# Altium footprint library FootprintHole.PcbLib: 100 footprints (part 7 of 7)
Each footprint in its own frame and in the unit in brackets; x right, y up, seen from the top. Pads: shape width x height; smd on the part's side, far side on the other; paste and mask are expansions set on the pad; w line width, h text height; cw(c..) or ccw(c..) is an arc to the next point about the centre after c.
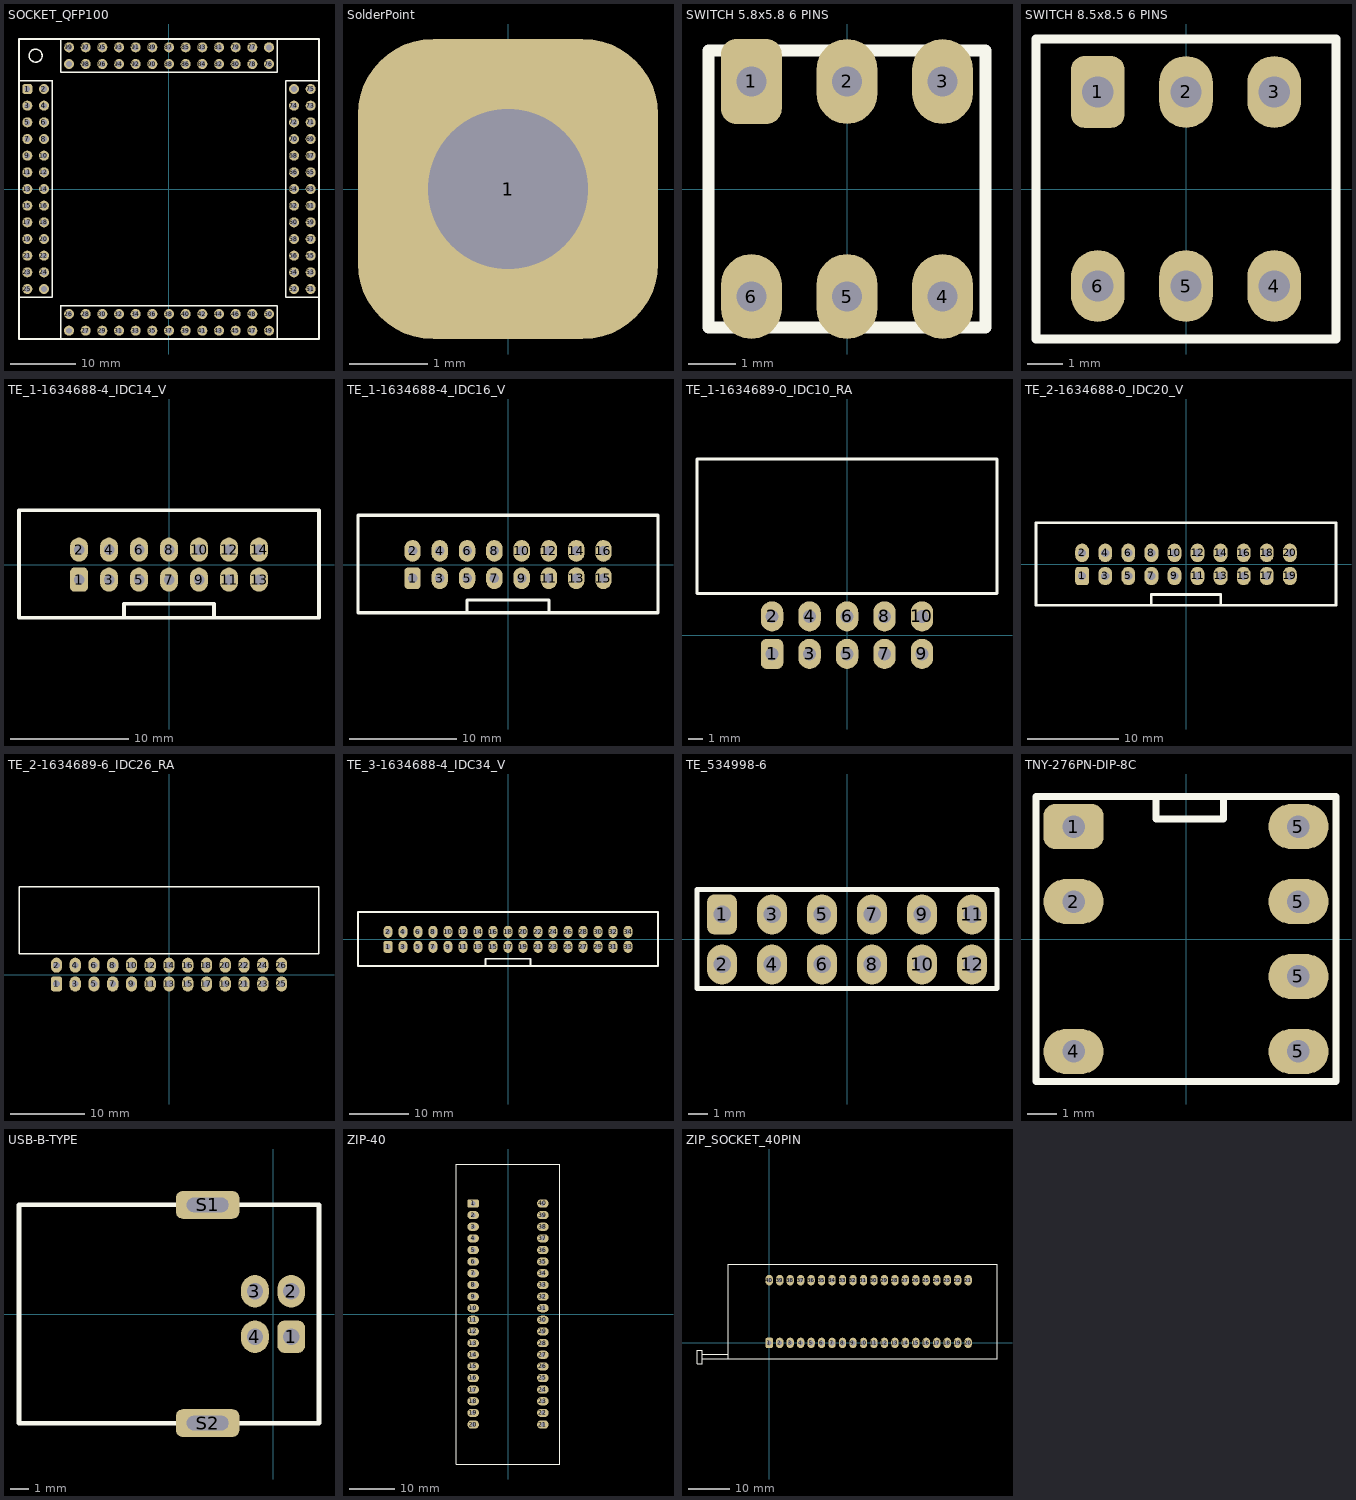
[diagram p6: the footprints below, top view; thin cyan lines are the x and y axes]

## SOCKET_QFP100 [mil]
pads (104):
  rrect50% 60x60 hole 35: 1(-850,600)
  round 60 hole 35: 2(-750,600) 3(-850,500) 4(-750,500) 5(-850,400) 6(-750,400) 7(-850,300) 8(-750,300) 9(-850,200) 10(-750,200) 11(-850,100) 12(-750,100) 13(-850,0) 14(-750,0) 15(-850,-100) 16(-750,-100) 17(-850,-200) 18(-750,-200) 19(-850,-300) 20(-750,-300) 21(-850,-400) 22(-750,-400) 23(-850,-500) 24(-750,-500) 25(-850,-600) 26(-600,-750) 27(-500,-850) 28(-500,-750) 29(-400,-850) 30(-400,-750) 31(-300,-850) 32(-300,-750) 33(-200,-850) 34(-200,-750) 35(-100,-850) 36(-100,-750) 37(0,-850) 38(0,-750) 39(100,-850) 40(100,-750) 41(200,-850) 42(200,-750) 43(300,-850) 44(300,-750) 45(400,-850) 46(400,-750) 47(500,-850) 48(500,-750) 49(600,-850) 50(600,-750) 51(850,-600) 52(750,-600) 53(850,-500) 54(750,-500) 55(850,-400) 56(750,-400) 57(850,-300) 58(750,-300) 59(850,-200) 60(750,-200) 61(850,-100) 62(750,-100) 63(850,0) 64(750,0) 65(850,100) 66(750,100) 67(850,200) 68(750,200) 69(850,300) 70(750,300) 71(850,400) 72(750,400) 73(850,500) 74(750,500) 75(850,600) 76(600,750) 77(500,850) 78(500,750) 79(400,850) 80(400,750) 81(300,850) 82(300,750) 83(200,850) 84(200,750) 85(100,850) 86(100,750) 87(0,850) 88(0,750) 89(-100,850) 90(-100,750) 91(-200,850) 92(-200,750) 93(-300,850) 94(-300,750) 95(-400,850) 96(-400,750) 97(-500,850) 98(-500,750) 99(-600,850) 100(-600,750) GND(-600,-850) GND(600,850) VCC(-750,-600) VCC(750,600)
Top Overlay:
  circle w10: c-800,800 r39.05
  lines w10: -700,650 -699.99,649.99 ; -699.99,649.99 -699.99,-649.98 -900,-649.98 -900,650 -700,650 ; -650,-700 -649.99,-699.99 ; -649.99,-699.99 649.98,-699.99 649.98,-900 -650,-900 -650,-700 ; -650,900 -649.99,900.01 ; -649.99,900.01 649.98,900.01 649.98,700 -650,700 -650,900 ; 900,650 900.01,649.99 ; 900.01,649.99 900.01,-649.98 700,-649.98 700,650 900,650 ; -900,-900 900,-900 900,900 -900,900 -900,-900
3D body "zl201-1_p2-54_l2-54_w2-54_h8-89.stp": height 350, standoff -120, extent -900,-649.98 -800,-549.98
3D body "zl201-1_p2-54_l2-54_w2-54_h8-89.stp": height 350, standoff -120, extent -799.99,-649.98 -699.99,-549.98
3D body "zl201-1_p2-54_l2-54_w2-54_h8-89.stp": height 350, standoff -120, extent -899.99,-549.98 -799.99,-449.98
3D body "zl201-1_p2-54_l2-54_w2-54_h8-89.stp": height 350, standoff -120, extent -799.99,-549.98 -699.99,-449.98
3D body "zl201-1_p2-54_l2-54_w2-54_h8-89.stp": height 350, standoff -120, extent -799.99,-449.99 -699.99,-349.99
3D body "zl201-1_p2-54_l2-54_w2-54_h8-89.stp": height 350, standoff -120, extent -900,-449.99 -800,-349.99
3D body "zl201-1_p2-54_l2-54_w2-54_h8-89.stp": height 350, standoff -120, extent -799.99,-349.99 -699.99,-249.99
3D body "zl201-1_p2-54_l2-54_w2-54_h8-89.stp": height 350, standoff -120, extent -900,-349.99 -800,-249.99
3D body "zl201-1_p2-54_l2-54_w2-54_h8-89.stp": height 350, standoff -120, extent -799.99,-249.99 -699.99,-149.99
3D body "zl201-1_p2-54_l2-54_w2-54_h8-89.stp": height 350, standoff -120, extent -900,-249.99 -800,-149.99
3D body "zl201-1_p2-54_l2-54_w2-54_h8-89.stp": height 350, standoff -120, extent -900,550 -800,650
3D body "zl201-1_p2-54_l2-54_w2-54_h8-89.stp": height 350, standoff -120, extent -800,550 -700,650
3D body "zl201-1_p2-54_l2-54_w2-54_h8-89.stp": height 350, standoff -120, extent -900,450.01 -800,550.01
3D body "zl201-1_p2-54_l2-54_w2-54_h8-89.stp": height 350, standoff -120, extent -800,450.01 -700,550.01
3D body "zl201-1_p2-54_l2-54_w2-54_h8-89.stp": height 350, standoff -120, extent -899.99,350.02 -799.99,450.02
3D body "zl201-1_p2-54_l2-54_w2-54_h8-89.stp": height 350, standoff -120, extent -900,250.01 -800,350.01
3D body "zl201-1_p2-54_l2-54_w2-54_h8-89.stp": height 350, standoff -120, extent -900,150.01 -800,250.01
3D body "zl201-1_p2-54_l2-54_w2-54_h8-89.stp": height 350, standoff -120, extent -900,50.01 -800,150.01
3D body "zl201-1_p2-54_l2-54_w2-54_h8-89.stp": height 350, standoff -120, extent -900,-49.99 -800,50.01
3D body "zl201-1_p2-54_l2-54_w2-54_h8-89.stp": height 350, standoff -120, extent -900,-149.99 -800,-49.99
3D body "zl201-1_p2-54_l2-54_w2-54_h8-89.stp": height 350, standoff -120, extent -800,350.01 -700,450.01
3D body "zl201-1_p2-54_l2-54_w2-54_h8-89.stp": height 350, standoff -120, extent -800,250.01 -700,350.01
3D body "zl201-1_p2-54_l2-54_w2-54_h8-89.stp": height 350, standoff -120, extent -800,150.01 -700,250.01
3D body "zl201-1_p2-54_l2-54_w2-54_h8-89.stp": height 350, standoff -120, extent -800,50.01 -700,150.01
3D body "zl201-1_p2-54_l2-54_w2-54_h8-89.stp": height 350, standoff -120, extent -799.99,-149.99 -699.99,-49.99
3D body "zl201-1_p2-54_l2-54_w2-54_h8-89.stp": height 350, standoff -120, extent -799.99,-49.99 -699.99,50.01
3D body "zl201-1_p2-54_l2-54_w2-54_h8-89.stp": height 350, standoff -120, extent 549.98,-900 649.98,-800
3D body "zl201-1_p2-54_l2-54_w2-54_h8-89.stp": height 350, standoff -120, extent 549.98,-799.99 649.98,-699.99
3D body "zl201-1_p2-54_l2-54_w2-54_h8-89.stp": height 350, standoff -120, extent 449.98,-899.99 549.98,-799.99
3D body "zl201-1_p2-54_l2-54_w2-54_h8-89.stp": height 350, standoff -120, extent 449.98,-799.99 549.98,-699.99
3D body "zl201-1_p2-54_l2-54_w2-54_h8-89.stp": height 350, standoff -120, extent 349.99,-799.99 449.99,-699.99
3D body "zl201-1_p2-54_l2-54_w2-54_h8-89.stp": height 350, standoff -120, extent 349.99,-900 449.99,-800
3D body "zl201-1_p2-54_l2-54_w2-54_h8-89.stp": height 350, standoff -120, extent 249.99,-799.99 349.99,-699.99
3D body "zl201-1_p2-54_l2-54_w2-54_h8-89.stp": height 350, standoff -120, extent 249.99,-900 349.99,-800
3D body "zl201-1_p2-54_l2-54_w2-54_h8-89.stp": height 350, standoff -120, extent 149.99,-799.99 249.99,-699.99
3D body "zl201-1_p2-54_l2-54_w2-54_h8-89.stp": height 350, standoff -120, extent 149.99,-900 249.99,-800
3D body "zl201-1_p2-54_l2-54_w2-54_h8-89.stp": height 350, standoff -120, extent -650,-900 -550,-800
3D body "zl201-1_p2-54_l2-54_w2-54_h8-89.stp": height 350, standoff -120, extent -650,-800 -550,-700
3D body "zl201-1_p2-54_l2-54_w2-54_h8-89.stp": height 350, standoff -120, extent -550.01,-900 -450.01,-800
3D body "zl201-1_p2-54_l2-54_w2-54_h8-89.stp": height 350, standoff -120, extent -550.01,-800 -450.01,-700
3D body "zl201-1_p2-54_l2-54_w2-54_h8-89.stp": height 350, standoff -120, extent -450.02,-899.99 -350.02,-799.99
3D body "zl201-1_p2-54_l2-54_w2-54_h8-89.stp": height 350, standoff -120, extent -350.01,-900 -250.01,-800
3D body "zl201-1_p2-54_l2-54_w2-54_h8-89.stp": height 350, standoff -120, extent -250.01,-900 -150.01,-800
3D body "zl201-1_p2-54_l2-54_w2-54_h8-89.stp": height 350, standoff -120, extent -150.01,-900 -50.01,-800
3D body "zl201-1_p2-54_l2-54_w2-54_h8-89.stp": height 350, standoff -120, extent -50.01,-900 49.99,-800
3D body "zl201-1_p2-54_l2-54_w2-54_h8-89.stp": height 350, standoff -120, extent 49.99,-900 149.99,-800
3D body "zl201-1_p2-54_l2-54_w2-54_h8-89.stp": height 350, standoff -120, extent -450.01,-800 -350.01,-700
3D body "zl201-1_p2-54_l2-54_w2-54_h8-89.stp": height 350, standoff -120, extent -350.01,-800 -250.01,-700
3D body "zl201-1_p2-54_l2-54_w2-54_h8-89.stp": height 350, standoff -120, extent -250.01,-800 -150.01,-700
3D body "zl201-1_p2-54_l2-54_w2-54_h8-89.stp": height 350, standoff -120, extent -150.01,-800 -50.01,-700
3D body "zl201-1_p2-54_l2-54_w2-54_h8-89.stp": height 350, standoff -120, extent 49.99,-799.99 149.99,-699.99
3D body "zl201-1_p2-54_l2-54_w2-54_h8-89.stp": height 350, standoff -120, extent -50.01,-799.99 49.99,-699.99
3D body "zl201-1_p2-54_l2-54_w2-54_h8-89.stp": height 350, standoff -120, extent 700,-649.98 800,-549.98
3D body "zl201-1_p2-54_l2-54_w2-54_h8-89.stp": height 350, standoff -120, extent 800.01,-649.98 900.01,-549.98
3D body "zl201-1_p2-54_l2-54_w2-54_h8-89.stp": height 350, standoff -120, extent 700.01,-549.98 800.01,-449.98
3D body "zl201-1_p2-54_l2-54_w2-54_h8-89.stp": height 350, standoff -120, extent 800.01,-549.98 900.01,-449.98
3D body "zl201-1_p2-54_l2-54_w2-54_h8-89.stp": height 350, standoff -120, extent 800.01,-449.99 900.01,-349.99
3D body "zl201-1_p2-54_l2-54_w2-54_h8-89.stp": height 350, standoff -120, extent 700,-449.99 800,-349.99
3D body "zl201-1_p2-54_l2-54_w2-54_h8-89.stp": height 350, standoff -120, extent 800.01,-349.99 900.01,-249.99
3D body "zl201-1_p2-54_l2-54_w2-54_h8-89.stp": height 350, standoff -120, extent 700,-349.99 800,-249.99
3D body "zl201-1_p2-54_l2-54_w2-54_h8-89.stp": height 350, standoff -120, extent 800.01,-249.99 900.01,-149.99
3D body "zl201-1_p2-54_l2-54_w2-54_h8-89.stp": height 350, standoff -120, extent 700,-249.99 800,-149.99
3D body "zl201-1_p2-54_l2-54_w2-54_h8-89.stp": height 350, standoff -120, extent 700,550 800,650
3D body "zl201-1_p2-54_l2-54_w2-54_h8-89.stp": height 350, standoff -120, extent 800,550 900,650
3D body "zl201-1_p2-54_l2-54_w2-54_h8-89.stp": height 350, standoff -120, extent 700,450.01 800,550.01
3D body "zl201-1_p2-54_l2-54_w2-54_h8-89.stp": height 350, standoff -120, extent 800,450.01 900,550.01
3D body "zl201-1_p2-54_l2-54_w2-54_h8-89.stp": height 350, standoff -120, extent 700.01,350.02 800.01,450.02
3D body "zl201-1_p2-54_l2-54_w2-54_h8-89.stp": height 350, standoff -120, extent 700,250.01 800,350.01
3D body "zl201-1_p2-54_l2-54_w2-54_h8-89.stp": height 350, standoff -120, extent 700,150.01 800,250.01
3D body "zl201-1_p2-54_l2-54_w2-54_h8-89.stp": height 350, standoff -120, extent 700,50.01 800,150.01
3D body "zl201-1_p2-54_l2-54_w2-54_h8-89.stp": height 350, standoff -120, extent 700,-49.99 800,50.01
3D body "zl201-1_p2-54_l2-54_w2-54_h8-89.stp": height 350, standoff -120, extent 700,-149.99 800,-49.99
3D body "zl201-1_p2-54_l2-54_w2-54_h8-89.stp": height 350, standoff -120, extent 800,350.01 900,450.01
3D body "zl201-1_p2-54_l2-54_w2-54_h8-89.stp": height 350, standoff -120, extent 800,250.01 900,350.01
3D body "zl201-1_p2-54_l2-54_w2-54_h8-89.stp": height 350, standoff -120, extent 800,150.01 900,250.01
3D body "zl201-1_p2-54_l2-54_w2-54_h8-89.stp": height 350, standoff -120, extent 800,50.01 900,150.01
3D body "zl201-1_p2-54_l2-54_w2-54_h8-89.stp": height 350, standoff -120, extent 800.01,-149.99 900.01,-49.99
3D body "zl201-1_p2-54_l2-54_w2-54_h8-89.stp": height 350, standoff -120, extent 800.01,-49.99 900.01,50.01
3D body "zl201-1_p2-54_l2-54_w2-54_h8-89.stp": height 350, standoff -120, extent 549.98,700 649.98,800
3D body "zl201-1_p2-54_l2-54_w2-54_h8-89.stp": height 350, standoff -120, extent 549.98,800.01 649.98,900.01
3D body "zl201-1_p2-54_l2-54_w2-54_h8-89.stp": height 350, standoff -120, extent 449.98,700.01 549.98,800.01
3D body "zl201-1_p2-54_l2-54_w2-54_h8-89.stp": height 350, standoff -120, extent 449.98,800.01 549.98,900.01
3D body "zl201-1_p2-54_l2-54_w2-54_h8-89.stp": height 350, standoff -120, extent 349.99,800.01 449.99,900.01
3D body "zl201-1_p2-54_l2-54_w2-54_h8-89.stp": height 350, standoff -120, extent 349.99,700 449.99,800
3D body "zl201-1_p2-54_l2-54_w2-54_h8-89.stp": height 350, standoff -120, extent 249.99,800.01 349.99,900.01
3D body "zl201-1_p2-54_l2-54_w2-54_h8-89.stp": height 350, standoff -120, extent 249.99,700 349.99,800
3D body "zl201-1_p2-54_l2-54_w2-54_h8-89.stp": height 350, standoff -120, extent 149.99,800.01 249.99,900.01
3D body "zl201-1_p2-54_l2-54_w2-54_h8-89.stp": height 350, standoff -120, extent 149.99,700 249.99,800
3D body "zl201-1_p2-54_l2-54_w2-54_h8-89.stp": height 350, standoff -120, extent -650,700 -550,800
3D body "zl201-1_p2-54_l2-54_w2-54_h8-89.stp": height 350, standoff -120, extent -650,800 -550,900
3D body "zl201-1_p2-54_l2-54_w2-54_h8-89.stp": height 350, standoff -120, extent -550.01,700 -450.01,800
3D body "zl201-1_p2-54_l2-54_w2-54_h8-89.stp": height 350, standoff -120, extent -550.01,800 -450.01,900
3D body "zl201-1_p2-54_l2-54_w2-54_h8-89.stp": height 350, standoff -120, extent -450.02,700.01 -350.02,800.01
3D body "zl201-1_p2-54_l2-54_w2-54_h8-89.stp": height 350, standoff -120, extent -350.01,700 -250.01,800
3D body "zl201-1_p2-54_l2-54_w2-54_h8-89.stp": height 350, standoff -120, extent -250.01,700 -150.01,800
3D body "zl201-1_p2-54_l2-54_w2-54_h8-89.stp": height 350, standoff -120, extent -150.01,700 -50.01,800
3D body "zl201-1_p2-54_l2-54_w2-54_h8-89.stp": height 350, standoff -120, extent -50.01,700 49.99,800
3D body "zl201-1_p2-54_l2-54_w2-54_h8-89.stp": height 350, standoff -120, extent 49.99,700 149.99,800
3D body "zl201-1_p2-54_l2-54_w2-54_h8-89.stp": height 350, standoff -120, extent -450.01,800 -350.01,900
3D body "zl201-1_p2-54_l2-54_w2-54_h8-89.stp": height 350, standoff -120, extent -350.01,800 -250.01,900
3D body "zl201-1_p2-54_l2-54_w2-54_h8-89.stp": height 350, standoff -120, extent -250.01,800 -150.01,900
3D body "zl201-1_p2-54_l2-54_w2-54_h8-89.stp": height 350, standoff -120, extent -150.01,800 -50.01,900
3D body "zl201-1_p2-54_l2-54_w2-54_h8-89.stp": height 350, standoff -120, extent 49.99,800.01 149.99,900.01
3D body "zl201-1_p2-54_l2-54_w2-54_h8-89.stp": height 350, standoff -120, extent -50.01,800.01 49.99,900.01

## SolderPoint [mil]
pads (1):
  rrect50% 150x150 hole 80: 1(0,0)

## SWITCH 5.8x5.8 6 PINS [mm]
pads (6):
  rrect50% 1.27x1.778 hole 0.635: 1(-2,2.25)
  oval 1.27x1.778 hole 0.635: 2(0,2.25) 3(2,2.25) 4(2,-2.25) 5(0,-2.25) 6(-2,-2.25)
Top Overlay:
  lines w0.254: -2.9,-2.9 2.9,-2.9 2.9,2.9 -2.9,2.9 -2.9,-2.9
3D body "5.8x5.8mmSWITCH.STEP": height 10, standoff -3.6, extent -2.9,-2.9 2.9,2.9

## SWITCH 8.5x8.5 6 PINS [mil]
pads (6):
  rrect50% 60x80 hole 35: 1(-98.43,108.27)
  oval 60x80 hole 35: 2(0,108.27) 3(98.43,108.27) 4(98.43,-108.27) 5(0,-108.27) 6(-98.43,-108.27)
Top Overlay:
  lines w10: -167.32,-167.32 167.32,-167.32 167.32,167.32 -167.32,167.32 -167.32,-167.32

## TE_1-1634688-4_IDC14_V [mil]
pads (14):
  rrect50% 60x80 hole 35: 1(-300,-50)
  oval 60x80 hole 35: 2(-300,50) 3(-200,-50) 4(-200,50) 5(-100,-50) 6(-100,50) 7(0,-50) 8(0,50) 9(100,-50) 10(100,50)
  oval 60x80 hole 35 paste+0 mask+2.99: 11(200,-50) 12(200,50) 13(300,-50) 14(300,50)
Top Overlay:
  lines w11.81: -150,-177.17 -150,-130 150,-130 150,-177.17 ; -500,-177.17 500,-177.17 500,181.1 -500,181.1 -500,-177.17
3D body "TE_1-1634688-4_IDC14_V.STEP": height 358.27, standoff -125.98, extent -500.58,-177.16 500.6,181.11

## TE_1-1634688-4_IDC16_V [mil]
pads (16):
  rrect50% 60x80 hole 35: 1(-350,-50)
  oval 60x80 hole 35: 2(-350,50) 3(-250,-50) 4(-250,50) 5(-150,-50) 6(-150,50) 7(-50,-50) 8(-50,50) 9(50,-50) 10(50,50)
  oval 60x80 hole 35 paste+0 mask+2.99: 11(150,-50) 12(150,50) 13(250,-50) 14(250,50) 15(350,-50) 16(350,50)
Top Overlay:
  lines w11.81: -150,-177.17 -150,-130 150,-130 150,-177.17 ; -550,-177.17 550,-177.17 550,181.1 -550,181.1 -550,-177.17

## TE_1-1634689-0_IDC10_RA [mil]
pads (10):
  rrect50% 60x80 hole 35: 1(-200,-50)
  oval 60x80 hole 35: 2(-200,50) 3(-100,-50) 4(-100,50) 5(0,-50) 6(0,50) 7(100,-50) 8(100,50) 9(200,-50) 10(200,50)
Top Overlay:
  lines w7.87: -400,110.63 400,110.63 400,469.29 -400,469.29 -400,111.02
3D body "TE_1-1634689-0_IDC10_RA.STEP": height 357.17, standoff -119.21, extent -400.59,-63.22 400.6,468.28

## TE_2-1634688-0_IDC20_V [mil]
pads (20):
  rrect50% 60x80 hole 35: 1(-450,-50)
  oval 60x80 hole 35: 2(-450,50) 3(-350,-50) 4(-350,50) 5(-250,-50) 6(-250,50) 7(-150,-50) 8(-150,50) 9(-50,-50) 10(-50,50)
  oval 60x80 hole 35 paste+0 mask+2.99: 11(50,-50) 12(50,50) 13(150,-50) 14(150,50) 15(250,-50) 16(250,50) 17(350,-50) 18(350,50) 19(450,-50) 20(450,50)
Top Overlay:
  lines w11.81: -150,-177.17 -150,-130 150,-130 150,-177.17 ; -650,-177.17 -650,181.1 650,181.1 650,-177.17 -650,-177.17
3D body "TE_2-1634688-0_IDC20_V.STEP": height 358.27, standoff -125.98, extent -650.59,-177.16 650.6,181.11

## TE_2-1634689-6_IDC26_RA [mil]
pads (26):
  rrect50% 60x80 hole 35: 1(-600,-50)
  oval 60x80 hole 35: 2(-600,50) 3(-500,-50) 4(-500,50) 5(-400,-50) 6(-400,50) 7(-300,-50) 8(-300,50) 9(-200,-50) 10(-200,50)
  oval 60x80 hole 35 paste+0 mask+2.99: 11(-100,-50) 12(-100,50) 13(0,-50) 14(0,50) 15(100,-50) 16(100,50) 17(200,-50) 18(200,50) 19(300,-50) 20(300,50)
  oval 60x80 hole 35 mask+4.02: 21(400,-50) 22(400,50) 23(500,-50) 24(500,50) 25(600,-50) 26(600,50)
Top Overlay:
  lines w7.87: -800,110.63 800,110.63 800,469.29 -800,469.29 -800,111.02
3D body "TE_2-1634689-6_IDC26_RA.STEP": height 357.17, standoff -119.21, extent -800.6,-61.5 800.59,470

## TE_3-1634688-4_IDC34_V [mil]
pads (34):
  rrect50% 60x80 hole 35: 1(-800,-50)
  oval 60x80 hole 35: 2(-800,50) 3(-700,-50) 4(-700,50) 5(-600,-50) 6(-600,50) 7(-500,-50) 8(-500,50) 9(-400,-50) 10(-400,50)
  oval 60x80 hole 35 paste+0 mask+2.99: 11(-300,-50) 12(-300,50) 13(-200,-50) 14(-200,50) 15(-100,-50) 16(-100,50) 17(0,-50) 18(0,50) 19(100,-50) 20(100,50)
  oval 60x80 hole 35 mask+4.02: 21(200,-50) 22(200,50) 23(300,-50) 24(300,50) 25(400,-50) 26(400,50) 27(500,-50) 28(500,50) 29(600,-50) 30(600,50) 31(700,-50) 32(700,50) 33(800,-50) 34(800,50)
Top Overlay:
  lines w11.81: -150,-177.17 -150,-130 150,-130 150,-177.17 ; -1000,-177.17 1000,-177.17 1000,181.1 -1000,181.1 -1000,-177.17
3D body "TE_3-1634688-4_IDC34_V.STEP": height 358.27, standoff -125.98, extent -1000,-178.27 1001.18,180

## TE_534998-6 [mil]
pads (12):
  rrect50% 60x80 hole 35: 1(-250,50)
  oval 60x80 hole 35: 2(-250,-50) 3(-150,50) 4(-150,-50) 5(-50,50) 6(-50,-50) 7(50,50) 8(50,-50) 9(150,50) 10(150,-50) 11(250,50) 12(250,-50)
Top Overlay:
  lines w10: -300,-98.03 300,-98.03 300,100 -300,100 -300,-98.03
3D body "TE_534998-6.STEP": height 264.96, standoff -125.2, extent -300,-98.03 300,100

## TNY-276PN-DIP-8C [mil]
pads (7):
  rrect50% 80x60 hole 30: 1(-150,150)
  oval 80x60 hole 30: 2(-150,50) 4(-150,-150) 5(150,-150) 5(150,-50) 5(150,50) 5(150,150)
Top Overlay:
  lines w9.84: -40,190 -40,160 50,160 50,190 ; -200,-190 200,-190 200,190 -200,190 -200,-190
3D body "PDIP-8C_Assembly.stp": height 161.56, standoff -138.44, extent -155.27,-193.5 156.15,193.51

## USB-B-TYPE [mm]
pads (6):
  rrect50% 1.524x1.778 hole 0.889: 1(1,-1.25)
  oval 1.524x1.778 hole 0.889: 2(1,1.25) 3(-1,1.25) 4(-1,-1.25)
  rrect50% 3.5x1.524 hole 0.8 slot 2.3 at 0 deg: S1(-3.6,6) S2(-3.6,-6)
Top Overlay:
  lines w0.254: -13.975,-6 -13.975,6 2.525,6 2.525,-6 -13.975,-6
3D body "User Library-Samtec - USB-B-S-X-W-TH.STEP": height 11, standoff -3.64, extent -13.975,-7.423 2.525,7.375

## ZIP-40 [mil]
pads (40):
  rrect50% 100x70 hole 40: 1(-300,950)
  oval 100x70 hole 40: 2(-300,850) 3(-300,750) 4(-300,650) 5(-300,550) 6(-300,450) 7(-300,350) 8(-300,250) 9(-300,150) 10(-300,50) 11(-300,-50) 12(-300,-150) 13(-300,-250) 14(-300,-350) 15(-300,-450) 16(-300,-550) 17(-300,-650) 18(-300,-750) 19(-300,-850) 20(-300,-950) 21(300,-950) 22(300,-850) 23(300,-750) 24(300,-650) 25(300,-550) 26(300,-450) 27(300,-350) 28(300,-250) 29(300,-150) 30(300,-50) 31(300,50) 32(300,150) 33(300,250) 34(300,350) 35(300,450) 36(300,550) 37(300,650) 38(300,750) 39(300,850) 40(300,950)
Top Overlay:
  lines w10: -442.91,-1289.37 442.91,-1289.37 442.91,1289.37 -442.91,1289.37 -442.91,-1289.37
3D body "User Library-Zif-Zip Socket.STEP": height 841.34, standoff -123.04, extent -520.7,-1289.37 442.91,1588.04

## ZIP_SOCKET_40PIN [mil]
pads (40):
  rrect50% 70x100 hole 45: 1(0,0)
  oval 70x100 hole 45: 2(100,0) 3(200,0) 4(300,0) 5(400,0) 6(500,0) 7(600,0) 8(700,0) 9(800,0) 10(900,0) 11(1000,0) 12(1100,0) 13(1200,0) 14(1300,0) 15(1400,0) 16(1500,0) 17(1600,0) 18(1700,0) 19(1800,0) 20(1900,0) 21(1900,599.41) 22(1800,599.41) 23(1700,599.41) 24(1600,599.41) 25(1500,599.41) 26(1400,599.41) 27(1300,599.41) 28(1200,599.41) 29(1100,599.41) 30(1000,599.41) 31(900,599.41) 32(800,599.41) 33(700,599.41) 34(600,599.41) 35(500,599.41) 36(400,599.41) 37(300,599.41) 38(200,599.41) 39(100,599.41) 40(0,599.41)
Top Overlay:
  lines w5.91: -640,-153.05 -393.7,-153.05 ; -640,-108.44 -391.56,-108.44 ; -690,-200 -640,-200 -640,-70 -690,-70 -690,-200
  lines w10: -393.7,-153.05 2175.59,-153.05 2175.59,752.46 -393.7,752.46 -393.7,-153.05
3D body "User Library-Zif-Zip Socket.STEP": height 840.41, standoff -123.04, extent -687.16,-211.14 2188.98,752.48